# Altium footprint library IC.PcbLib: 162 footprints (part 3 of 11)
Each footprint in its own frame and in the unit in brackets; x right, y up, seen from the top. Pads: shape width x height; smd on the part's side, far side on the other; paste and mask are expansions set on the pad; w line width, h text height; cw(c..) or ccw(c..) is an arc to the next point about the centre after c.
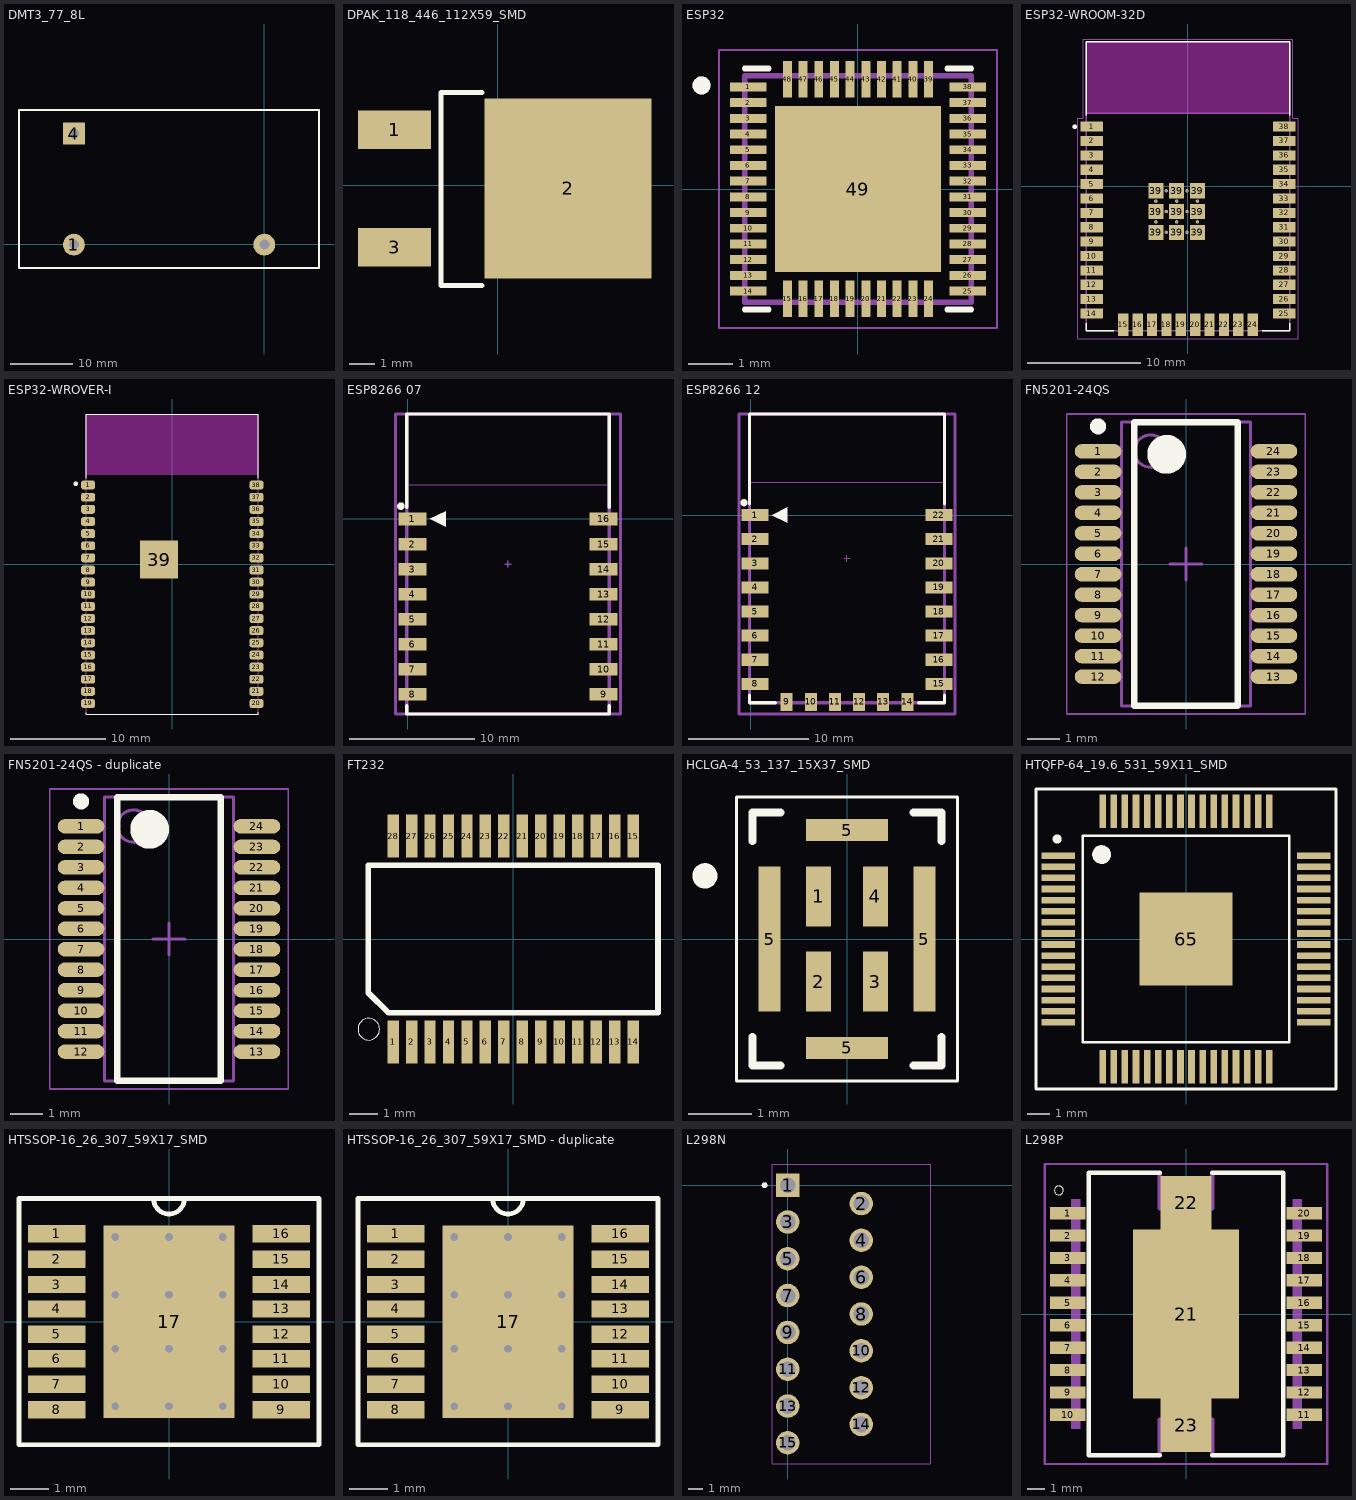
[diagram p2: the footprints below, top view; thin cyan lines are the x and y axes]

## DMT3_77_8L [mm] "CASE: TH"
height 48.3
pads (3):
  round 3.5 hole 1.6: 1(-30.5,-0.05) ""(0,-0.05)
  rect 3.5x3.5 hole 1.6: 4(-30.5,17.75)
Top Overlay:
  lines w0.254: 5.736,21.514 -39.294,21.514 -39.294,17.456 -39.294,-3.785 4.035,-3.785 8.763,-3.785 8.763,21.514 5.75,21.514
3D body: height 48, standoff 0.1, extent -39,-3.5 8.5,21.25

## DPAK_118_446_112X59_SMD [mm] "CASE: DPAK"
height 2.39
pads (3):
  rect 2.85x1.5 smd: 1(-4.023,2.163) 3(-4.023,-2.417)
  rect 6.5x7 smd: 2(2.727,-0.127)
Top Overlay:
  lines w0.2: -0.623,-3.9 -2.223,-3.9 -2.223,3.6 -0.623,3.6
3D body "User Library-TO252AA.step": height 2.3, standoff -0.01, extent -4.469,-3.429 5.231,3.151

## ESP32 [mm]
pads (49):
  rrect5% 0.81x0.2 smd: 1(-2.445,2.275) 2(-2.445,1.925) 3(-2.445,1.575) 4(-2.445,1.225) 5(-2.445,0.875) 6(-2.445,0.525) 7(-2.445,0.175) 8(-2.445,-0.175) 9(-2.445,-0.525) 10(-2.445,-0.875) 11(-2.445,-1.225) 12(-2.445,-1.575) 13(-2.445,-1.925) 14(-2.445,-2.275) 25(2.445,-2.275) 26(2.445,-1.925) 27(2.445,-1.575) 28(2.445,-1.225) 29(2.445,-0.875) 30(2.445,-0.525) 31(2.445,-0.175) 32(2.445,0.175) 33(2.445,0.525) 34(2.445,0.875) 35(2.445,1.225) 36(2.445,1.575) 37(2.445,1.925) 38(2.445,2.275)
  rrect5% 0.2x0.81 smd: 15(-1.575,-2.445) 16(-1.225,-2.445) 17(-0.875,-2.445) 18(-0.525,-2.445) 19(-0.175,-2.445) 20(0.175,-2.445) 21(0.525,-2.445) 22(0.875,-2.445) 23(1.225,-2.445) 24(1.575,-2.445) 39(1.575,2.445) 40(1.225,2.445) 41(0.875,2.445) 42(0.525,2.445) 43(0.175,2.445) 44(-0.175,2.445) 45(-0.525,2.445) 46(-0.875,2.445) 47(-1.225,2.445) 48(-1.575,2.445)
  rect 3.7x3.7 smd paste-3: 49(0,0)
Top Overlay:
  circle w0.2: c-3.49,2.31 r0.1
  lines w0.127: -2.525,-2.689 -1.99,-2.689 ; -2.525,2.689 -1.99,2.689 ; 1.99,-2.689 2.525,-2.689 ; 1.99,2.689 2.525,2.689
Top Paste:
  region: 1.49,-1.49 0.18,-1.49 0.18,-0.18 1.49,-0.18
  region: -0.18,-1.49 -1.49,-1.49 -1.49,-0.18 -0.18,-0.18
  region: 1.49,0.18 0.18,0.18 0.18,1.49 1.49,1.49
  region: -0.18,0.18 -1.49,0.18 -1.49,1.49 -0.18,1.49
Mechanical 13:
  circle w0.2: c-3.49,2.31 r0.1
  lines w0.127: -2.525,-2.525 2.525,-2.525 2.525,2.525 -2.525,2.525 -2.525,-2.525
Mechanical 15:
  lines w0.05: -3.1,-3.1 -3.1,3.1 3.1,3.1 3.1,-3.1 -3.1,-3.1

## ESP32-WROOM-32D [mm]
pads (59):
  rect 2x0.9 smd: 1(-8.5,5.26) 2(-8.5,3.99) 3(-8.5,2.72) 4(-8.5,1.45) 5(-8.5,0.18) 6(-8.5,-1.09) 7(-8.5,-2.36) 8(-8.5,-3.63) 9(-8.5,-4.9) 10(-8.5,-6.17) 11(-8.5,-7.44) 12(-8.5,-8.71) 13(-8.5,-9.98) 14(-8.5,-11.25) 25(8.5,-11.25) 26(8.5,-9.98) 27(8.5,-8.71) 28(8.5,-7.44) 29(8.5,-6.17) 30(8.5,-4.9) 31(8.5,-3.63) 32(8.5,-2.36) 33(8.5,-1.09) 34(8.5,0.18) 35(8.5,1.45) 36(8.5,2.72) 37(8.5,3.99) 38(8.5,5.26)
  rect 0.9x2 smd: 15(-5.715,-12.25) 16(-4.445,-12.25) 17(-3.175,-12.25) 18(-1.905,-12.25) 19(-0.635,-12.25) 20(0.635,-12.25) 21(1.905,-12.25) 22(3.175,-12.25) 23(4.445,-12.25) 24(5.715,-12.25)
  rect 1.33x1.33 smd: 39(-2.835,-4.075) 39(-2.835,-2.24) 39(-2.835,-0.405) 39(-1,-4.075) 39(-1,-2.24) 39(-1,-0.405) 39(0.835,-4.075) 39(0.835,-2.24) 39(0.835,-0.405)
  round 0.3 hole 0.2: 39(-2.835,-3.157) 39(-2.835,-1.322) 39(-1.917,-4.075) 39(-1.917,-2.24) 39(-1.917,-0.405) 39(-1,-3.157) 39(-1,-1.322) 39(-0.082,-4.075) 39(-0.082,-2.24) 39(-0.082,-0.405) 39(0.835,-3.157) 39(0.835,-1.322)
Top Overlay:
  circle w0.2: c-10,5.25 r0.1
  lines w0.127: -9,-12.1 -9,-12.75 -6.55,-12.75 ; -9,6.25 -9,12.75 9,12.75 9,6.25 ; 6.55,-12.75 9,-12.75 9,-12.1
Keep-Out Layer:
  region: 9,6.45 -9,6.45 -9,12.75 9,12.75
  region: 9,6.45 -9,6.45 -9,12.75 9,12.75
Mechanical 13:
  circle w0.2: c-10,5.25 r0.1
  lines w0.127: -9,6.45 -9,-12.75 9,-12.75 9,6.45 ; -9,6.45 -9,12.75 9,12.75 9,6.45 ; -9,6.45 9,6.45
  text "ANTENNA" at -6,9 h1.78
Mechanical 15:
  lines w0.05: -9.75,-13.5 9.75,-13.5 9.75,6 9.25,6 9.25,13 -9.25,13 -9.25,6 -9.75,6 -9.75,-13.5
3D body "ESP32-WROOM-32.STEP": height 3.2, standoff 0, extent -9,-12.623 9,12.877

## ESP32-WROVER-I [mm]
pads (39):
  rrect50% 1.45x0.93 smd: 1(-8.81,8.26) 2(-8.81,6.99) 3(-8.81,5.72) 4(-8.81,4.45) 5(-8.81,3.18) 6(-8.81,1.91) 7(-8.81,0.64) 8(-8.81,-0.63) 9(-8.81,-1.9) 10(-8.81,-3.17) 11(-8.81,-4.44) 12(-8.81,-5.71) 13(-8.81,-6.98) 14(-8.81,-8.25) 15(-8.81,-9.52) 16(-8.81,-10.79) 17(-8.81,-12.06) 18(-8.81,-13.33) 19(-8.81,-14.6) 20(8.81,-14.6) 21(8.81,-13.33) 22(8.81,-12.06) 23(8.81,-10.79) 24(8.81,-9.52) 25(8.81,-8.25) 26(8.81,-6.98) 27(8.81,-5.71) 28(8.81,-4.44) 29(8.81,-3.17) 30(8.81,-1.9) 31(8.81,-0.63) 32(8.81,0.64) 33(8.81,1.91) 34(8.81,3.18) 35(8.81,4.45) 36(8.81,5.72) 37(8.81,6.99) 38(8.81,8.26)
  rect 4x4 smd paste-3: 39(-1.38,0.47)
Top Overlay:
  circle w0.24: c-10.1,8.4 r0.12
  lines w0.127: -9,-15.55 -9,-15.7 9,-15.7 9,-15.5 ; -9,8.95 -9,15.7 9,15.7 9,8.95
Top Paste:
  region: -0.115,-0.796 -2.648,-0.796 -2.648,1.735 -0.115,1.735
Keep-Out Layer:
  region: 9,9.324 -9.023,9.324 -9.023,15.7 9,15.7
  region: 9,9.331 -9.03,9.331 -9.03,15.7 9,15.7
  region: 9,9.33 -9.029,9.33 -9.029,15.7 9,15.7
Mechanical 13:
  lines w0.127: -9,-15.7 9,-15.7 9,15.7 -9,15.7 -9,-15.7
3D body "ESP32-WROVER-I--3DModel-STEP-56544.STEP": height 3.65, standoff 0, extent -9.011,-15.7 8.988,15.7

## ESP8266 07 [mm] "ESP-12 Wi-Fi Module by AI-Thinker"
height 3.2
pads (16):
  rect 2.25x1 smd: 1(0.375,0) 2(0.375,-2) 3(0.375,-4) 4(0.375,-6) 5(0.375,-8) 6(0.375,-10) 7(0.375,-12) 8(0.375,-14) 9(15.625,-14) 10(15.625,-12) 11(15.625,-10) 12(15.625,-8) 13(15.625,-6) 14(15.625,-4) 15(15.625,-2) 16(15.625,0)
Top Overlay:
  circle w0.3: c-0.55,1.025 r0.15
  region: 1.77,0 3.04,-0.635 3.04,0.635
  lines w0.254: -0.084,-14.916 -0.084,-15.568 16.084,-15.568 16.084,-14.916 ; -0.084,0.916 -0.084,8.371 16.084,8.371 16.084,0.916
Mechanical 13:
  lines w0.051: -0.127,2.727 16.129,2.727 16.129,8.382 -0.127,8.382 -0.127,2.727
  lines w0.254: -0.084,-15.568 -0.084,8.371 16.084,8.371 16.084,-15.568 -0.084,-15.568
  text "ANTENNA AREA" at 0.127,7.874 h0.25
  text "CUTOUT POLYGON" at 0.127,7.366 h0.25
Mechanical 15:
  lines w0.1: 7.746,-3.598 8.254,-3.598 ; 8,-3.852 8,-3.344
  lines w0.254: -0.975,-15.568 16.975,-15.568 16.975,8.371 -0.975,8.371 -0.975,-15.568
3D body "ESP_12_E.STEP": height 2.75, standoff 0.04, extent 0.001,-15.491 16.001,8.509

## ESP8266 12 [mm] "ESP-12 Wi-Fi Module by AI-Thinker"
height 3.2
pads (22):
  rect 2.25x1 smd: 1(0.375,0) 2(0.375,-2) 3(0.375,-4) 4(0.375,-6) 5(0.375,-8) 6(0.375,-10) 7(0.375,-12) 8(0.375,-14) 15(15.625,-14) 16(15.625,-12) 17(15.625,-10) 18(15.625,-8) 19(15.625,-6) 20(15.625,-4) 21(15.625,-2) 22(15.625,0)
  rect 1x1.5 smd: 9(3,-15.5) 10(5,-15.5) 11(7,-15.5) 12(9,-15.5) 13(11,-15.5) 14(13,-15.5)
Top Overlay:
  circle w0.3: c-0.55,1.025 r0.15
  region: 1.77,0 3.04,-0.635 3.04,0.635
  lines w0.254: -0.084,-14.916 -0.084,-15.568 2.068,-15.568 ; -0.084,0.916 -0.084,8.371 16.084,8.371 16.084,0.916 ; 13.932,-15.568 16.084,-15.568 16.084,-14.916
Mechanical 13:
  lines w0.051: -0.127,2.727 -0.127,8.382 16.129,8.382 16.129,2.727 -0.127,2.727
  lines w0.254: -0.084,-15.568 16.084,-15.568 16.084,8.371 -0.084,8.371 -0.084,-15.568
  text "CUTOUT POLYGON" at 0.127,7.366 h0.25
  text "ANTENNA AREA" at 0.127,7.874 h0.25
Mechanical 15:
  lines w0.1: 7.746,-3.598 8.254,-3.598 ; 8,-3.852 8,-3.344
  lines w0.254: -0.975,-16.5 -0.975,8.371 16.975,8.371 16.975,-16.5 -0.975,-16.5
3D body "ESP_12_E.STEP": height 2.75, standoff 0.04, extent 0.001,-15.491 16.001,8.509

## FN5201-24QS [mm] "SOP, 24-Leads, Body 8,65x3,90mm, Pitch 0,64mm, IPC Medium Density"
height 1.75
pads (24):
  oval 1.45x0.45 smd: 1(-2.725,3.492) 2(-2.725,2.857) 3(-2.725,2.222) 4(-2.725,1.587) 5(-2.725,0.953) 6(-2.725,0.318) 7(-2.725,-0.318) 8(-2.725,-0.953) 9(-2.725,-1.587) 10(-2.725,-2.222) 11(-2.725,-2.857) 12(-2.725,-3.492) 13(2.725,-3.492) 14(2.725,-2.857) 15(2.725,-2.222) 16(2.725,-1.587) 17(2.725,-0.953) 18(2.725,-0.318) 19(2.725,0.318) 20(2.725,0.953) 21(2.725,1.587) 22(2.725,2.222) 23(2.725,2.857) 24(2.725,3.492)
Top Overlay:
  circle w0.25: c-2.725,4.267 r0.125
  circle w0.6: c-0.6,3.4 r0.3
  lines w0.2: -1.6,-4.4 -1.6,4.4 1.6,4.4 1.6,-4.4 -1.6,-4.4
Mechanical 13:
  circle w0.1: c-1.1,3.5 r0.5
  lines w0.1: -2,-4.4 -2,4.4 2,4.4 2,-4.4 -2,-4.4
Mechanical 15:
  lines w0.05: -3.7,-4.65 -3.7,4.65 3.7,4.65 3.7,-4.65 -3.7,-4.65
  lines w0.1: -0.5,0 0.5,0 ; 0,-0.5 0,0.5
3D body "User Library-QSOP24-2.STEP": height 1.61, standoff 0.01, extent -3.062,-4.332 2.921,4.318

## FN5201-24QS - duplicate [mm] "SOP, 24-Leads, Body 8,65x3,90mm, Pitch 0,64mm, IPC Medium Density"
height 1.75
pads (24):
  oval 1.45x0.45 smd: 1(-2.725,3.492) 2(-2.725,2.857) 3(-2.725,2.222) 4(-2.725,1.587) 5(-2.725,0.953) 6(-2.725,0.318) 7(-2.725,-0.318) 8(-2.725,-0.953) 9(-2.725,-1.587) 10(-2.725,-2.222) 11(-2.725,-2.857) 12(-2.725,-3.492) 13(2.725,-3.492) 14(2.725,-2.857) 15(2.725,-2.222) 16(2.725,-1.587) 17(2.725,-0.953) 18(2.725,-0.318) 19(2.725,0.318) 20(2.725,0.953) 21(2.725,1.587) 22(2.725,2.222) 23(2.725,2.857) 24(2.725,3.492)
Top Overlay:
  circle w0.6: c-0.6,3.4 r0.3
  circle w0.25: c-2.725,4.267 r0.125
  lines w0.2: -1.6,-4.4 1.6,-4.4 1.6,4.4 -1.6,4.4 -1.6,-4.4
Mechanical 13:
  circle w0.1: c-1.1,3.5 r0.5
  lines w0.1: -2,-4.4 2,-4.4 2,4.4 -2,4.4 -2,-4.4
Mechanical 15:
  lines w0.05: -3.7,-4.65 3.7,-4.65 3.7,4.65 -3.7,4.65 -3.7,-4.65
  lines w0.1: -0.5,0 0.5,0 ; 0,-0.5 0,0.5
3D body "User Library-QSOP24-2.STEP": height 1.61, standoff 0.01, extent -3.062,-4.332 2.921,4.318

## FT232 [mm]
pads (28):
  rect 0.4x1.5 smd: 1(-4.225,-3.625) 2(-3.575,-3.625) 3(-2.925,-3.625) 4(-2.275,-3.625) 5(-1.625,-3.625) 6(-0.975,-3.625) 7(-0.325,-3.625) 8(0.325,-3.625) 9(0.975,-3.625) 10(1.625,-3.625) 11(2.275,-3.625) 12(2.925,-3.625) 13(3.575,-3.625) 14(4.225,-3.625) 15(4.225,3.625) 16(3.575,3.625) 17(2.925,3.625) 18(2.275,3.625) 19(1.625,3.625) 20(0.975,3.625) 21(0.325,3.625) 22(-0.325,3.625) 23(-0.975,3.625) 24(-1.625,3.625) 25(-2.275,3.625) 26(-2.925,3.625) 27(-3.575,3.625) 28(-4.225,3.625)
Top Overlay:
  circle w0: c-5.08,-3.175 r0.381
  lines w0.203: -5.1,-1.89 -5.1,2.6 5.1,2.6 5.1,-2.6 -4.39,-2.6 -5.1,-1.89
3D body "FT232RL--3DModel-STEP-56544.STEP": height 2, standoff 0, extent -5.1,-3.9 5.1,3.9

## HCLGA-4_53_137_15X37_SMD [mm]
pads (8):
  rect 0.4x0.95 smd: 1(-0.45,0.675) 2(-0.45,-0.675) 3(0.45,-0.675) 4(0.45,0.675)
  rect 0.35x2.3 smd: 5(-1.225,0) 5(1.225,0)
  rect 1.3x0.35 smd: 5(0,-1.725) 5(0,1.725)
Top Overlay:
  circle w0.2: c-2.25,1 r0.1
  lines w0.05: -1.75,-2.25 1.75,-2.25 1.75,2.25 -1.75,2.25 -1.75,-2.25
  lines w0.127: -1.5,-1.55 -1.5,-2 -1.05,-2 ; -1.5,1.55 -1.5,2 -1.05,2 ; 1.05,-2 1.5,-2 1.5,-1.55 ; 1.05,2 1.5,2 1.5,1.55
3D body "User Library-hclga_4l.step": height 1.02, standoff 0.01, extent -1.5,-2 1.5,2

## HTQFP-64_19.6_531_59X11_SMD [mm] "HTQFP package"
height 1.2
pads (65):
  rect 1.5x0.3 smd: 1(-5.75,3.75) 2(-5.75,3.25) 3(-5.75,2.75) 4(-5.75,2.25) 5(-5.75,1.75) 6(-5.75,1.25) 7(-5.75,0.75) 8(-5.75,0.25) 9(-5.75,-0.25) 10(-5.75,-0.75) 11(-5.75,-1.25) 12(-5.75,-1.75) 13(-5.75,-2.25) 14(-5.75,-2.75) 15(-5.75,-3.25) 16(-5.75,-3.75) 33(5.75,-3.75) 34(5.75,-3.25) 35(5.75,-2.75) 36(5.75,-2.25) 37(5.75,-1.75) 38(5.75,-1.25) 39(5.75,-0.75) 40(5.75,-0.25) 41(5.75,0.25) 42(5.75,0.75) 43(5.75,1.25) 44(5.75,1.75) 45(5.75,2.25) 46(5.75,2.75) 47(5.75,3.25) 48(5.75,3.75)
  rect 0.3x1.5 smd: 17(-3.75,-5.75) 18(-3.25,-5.75) 19(-2.75,-5.75) 20(-2.25,-5.75) 21(-1.75,-5.75) 22(-1.25,-5.75) 23(-0.75,-5.75) 24(-0.25,-5.75) 25(0.25,-5.75) 26(0.75,-5.75) 27(1.25,-5.75) 28(1.75,-5.75) 29(2.25,-5.75) 30(2.75,-5.75) 31(3.25,-5.75) 32(3.75,-5.75) 49(3.75,5.75) 50(3.25,5.75) 51(2.75,5.75) 52(2.25,5.75) 53(1.75,5.75) 54(1.25,5.75) 55(0.75,5.75) 56(0.25,5.75) 57(-0.25,5.75) 58(-0.75,5.75) 59(-1.25,5.75) 60(-1.75,5.75) 61(-2.25,5.75) 62(-2.75,5.75) 63(-3.25,5.75) 64(-3.75,5.75)
  rect 4.2x4.2 smd: 65(0,0)
Top Overlay:
  circle w0.305: c-5.8,4.5 r0.05
  circle w0.127: c-5.8,4.5 r0.141
  circle w0.305: c-3.8,3.8 r0.141
  circle w0.127: c-3.8,3.8 r0.224
  circle w0.127: c-3.8,3.8 r0.283
  circle w0.127: c-3.8,3.8 r0.283
  circle w0.127: c-3.8,3.8 r0.361
  lines w0.127: -6.75,-6.75 -6.75,6.75 6.75,6.75 6.75,-6.75 -6.75,-6.75 ; -4.65,-4.65 -4.65,4.65 4.65,4.65 4.65,-4.65 -4.65,-4.65

## HTSSOP-16_26_307_59X17_SMD [mm] "16-PowerTSSOP"
height 1.2
pads (17):
  rect 1.5x0.45 smd mask+0.076: 1(-2.921,2.286) 2(-2.921,1.626) 3(-2.921,0.965) 4(-2.921,0.33) 5(-2.921,-0.33) 6(-2.921,-0.965) 7(-2.921,-1.626) 8(-2.921,-2.286) 9(2.921,-2.286) 10(2.921,-1.626) 11(2.921,-0.965) 12(2.921,-0.33) 13(2.921,0.33) 14(2.921,0.965) 15(2.921,1.626) 16(2.921,2.286)
  rect 3.4x5 smd: 17(0,0)
via -1.4,2.2 diameter 0.4 hole 0.2
via 0,2.2 diameter 0.4 hole 0.2
via 1.4,2.2 diameter 0.4 hole 0.2
via 1.4,0.7 diameter 0.4 hole 0.2
via 0,0.7 diameter 0.4 hole 0.2
via -1.4,0.7 diameter 0.4 hole 0.2
via 1.4,-0.7 diameter 0.4 hole 0.2
via 0,-0.7 diameter 0.4 hole 0.2
via -1.4,-0.7 diameter 0.4 hole 0.2
via 1.4,-2.2 diameter 0.4 hole 0.2
via 0,-2.2 diameter 0.4 hole 0.2
via -1.4,-2.2 diameter 0.4 hole 0.2
Top Overlay:
  lines w0.127: -0.4,3.2 ccw(c0,3.2) 0.4,3.2 ; -3.9,-3.2 -3.9,3.2 3.9,3.2 3.9,-3.2 -3.9,-3.2
3D body "User Library-TSSOP-16-1.step": height 1.1, standoff 0, extent -3.2,-2.5 3.2,2.5

## HTSSOP-16_26_307_59X17_SMD - duplicate [mm] "16-PowerTSSOP"
height 1.2
pads (17):
  rect 1.5x0.45 smd mask+0.076: 1(-2.921,2.286) 2(-2.921,1.626) 3(-2.921,0.965) 4(-2.921,0.33) 5(-2.921,-0.33) 6(-2.921,-0.965) 7(-2.921,-1.626) 8(-2.921,-2.286) 9(2.921,-2.286) 10(2.921,-1.626) 11(2.921,-0.965) 12(2.921,-0.33) 13(2.921,0.33) 14(2.921,0.965) 15(2.921,1.626) 16(2.921,2.286)
  rect 3.4x5 smd: 17(0,0)
via -1.4,2.2 diameter 0.4 hole 0.2
via 0,2.2 diameter 0.4 hole 0.2
via 1.4,2.2 diameter 0.4 hole 0.2
via 1.4,0.7 diameter 0.4 hole 0.2
via 0,0.7 diameter 0.4 hole 0.2
via -1.4,0.7 diameter 0.4 hole 0.2
via 1.4,-0.7 diameter 0.4 hole 0.2
via 0,-0.7 diameter 0.4 hole 0.2
via -1.4,-0.7 diameter 0.4 hole 0.2
via 1.4,-2.2 diameter 0.4 hole 0.2
via 0,-2.2 diameter 0.4 hole 0.2
via -1.4,-2.2 diameter 0.4 hole 0.2
Top Overlay:
  lines w0.127: -0.4,3.2 ccw(c0,3.2) 0.4,3.2 ; -3.9,-3.2 -3.9,3.2 3.9,3.2 3.9,-3.2 -3.9,-3.2
3D body "User Library-TSSOP-16-1.step": height 1.1, standoff 0, extent -3.2,-2.5 3.2,2.5

## L298N [mm]
pads (15):
  rect 1.62x1.62 hole 1.08: 1(0,0)
  round 1.62 hole 1.08: 2(5.08,-1.27) 3(0,-2.54) 4(5.08,-3.81) 5(0,-5.08) 6(5.08,-6.35) 7(0,-7.62) 8(5.08,-8.89) 9(0,-10.16) 10(5.08,-11.43) 11(0,-12.7) 12(5.08,-13.97) 13(0,-15.24) 14(5.08,-16.51) 15(0,-17.78)
Top Overlay:
  circle w0.2: c-1.59,0 r0.1
Mechanical 13:
  circle w0.2: c-1.59,0 r0.1
Mechanical 15:
  lines w0.05: -1.06,-19.24 9.88,-19.24 9.88,1.46 -1.06,1.46 -1.06,-19.24
3D body "l298n.stp": height 23.85, standoff -1.1, extent -0.238,-18.89 9.652,1.11

## L298P [mm]
pads (23):
  rect 2x0.7 smd: 1(-6.7,5.715) 2(-6.7,4.445) 3(-6.7,3.175) 4(-6.7,1.905) 5(-6.7,0.635) 6(-6.7,-0.635) 7(-6.7,-1.905) 8(-6.7,-3.175) 9(-6.7,-4.445) 10(-6.7,-5.715) 11(6.7,-5.715) 12(6.7,-4.445) 13(6.7,-3.175) 14(6.7,-1.905) 15(6.7,-0.635) 16(6.7,0.635) 17(6.7,1.905) 18(6.7,3.175) 19(6.7,4.445) 20(6.7,5.715)
  rect 6x9.6 smd paste-6: 21(0,0)
  rect 2.9x3.05 smd paste-3: 22(0,6.3) 23(0,-6.3)
Top Overlay:
  circle w0: c-7.2,7 r0.254
  lines w0.254: -1.5,-8 -5.5,-8 -5.5,8 -1.5,8 ; 1.5,-8 5.5,-8 5.5,8 1.5,8
Top Paste:
  region: 1.9,-3.001 -1.901,-3.001 -1.901,3 1.9,3
Mechanical 13:
  circle w0.127: c0,-5 r0.671
  circle w0.127: c0,5 r0.671
  region: 6.553,4.932 6.051,4.932 6.051,6.502 6.553,6.502
  region: 6.553,3.658 6.046,3.658 6.046,5.232 6.553,5.232
  region: 6.553,2.389 6.048,2.389 6.048,3.962 6.553,3.962
  region: 6.553,1.118 6.049,1.118 6.049,2.692 6.553,2.692
  region: 6.553,-0.152 6.048,-0.152 6.048,1.422 6.553,1.422
  region: 6.553,-1.424 6.053,-1.424 6.053,0.152 6.553,0.152
  region: 6.553,-2.695 6.051,-2.695 6.051,-1.118 6.553,-1.118
  region: 6.553,-3.964 6.048,-3.964 6.048,-2.388 6.553,-2.388
  region: 6.553,-5.242 6.056,-5.242 6.056,-3.658 6.553,-3.658
  region: 6.553,-6.507 6.05,-6.507 6.05,-4.928 6.553,-4.928
  region: -5.994,-6.511 -6.511,-6.511 -6.511,-4.928 -5.994,-4.928
  region: -5.994,-5.24 -6.512,-5.24 -6.512,-3.658 -5.994,-3.658
  region: -5.994,-3.964 -6.505,-3.964 -6.505,-2.388 -5.994,-2.388
  region: -5.994,-2.697 -6.513,-2.697 -6.513,-1.118 -5.994,-1.118
  region: -5.994,-1.425 -6.514,-1.425 -6.514,0.152 -5.994,0.152
  region: -5.994,-0.153 -6.515,-0.153 -6.515,1.422 -5.994,1.422
  region: -5.994,1.12 -6.515,1.12 -6.515,2.692 -5.994,2.692
  region: -5.994,2.389 -6.507,2.389 -6.507,3.962 -5.994,3.962
  region: -5.994,3.661 -6.508,3.661 -6.508,5.232 -5.994,5.232
  region: -5.994,4.932 -6.508,4.932 -6.508,6.502 -5.994,6.502
  lines w0.254: -1.5,-8 -1.5,-6 1.5,-6 1.5,-8 ; -1.5,8 -1.5,6 1.5,6 1.5,8
Mechanical 15:
  lines w0.127: -8,-8.5 8,-8.5 8,8.5 -8,8.5 -8,-8.5
3D body "l298p.stp": height 3.14, standoff -0.14, extent -7.112,-7.899 7.074,8.001